# Altium footprint library WTR-PCB_LIB.PcbLib: 44 footprints (part 1 of 3)
Each footprint in its own frame and in the unit in brackets; x right, y up, seen from the top. Pads: shape width x height; smd on the part's side, far side on the other; paste and mask are expansions set on the pad; w line width, h text height; cw(c..) or ccw(c..) is an arc to the next point about the centre after c.
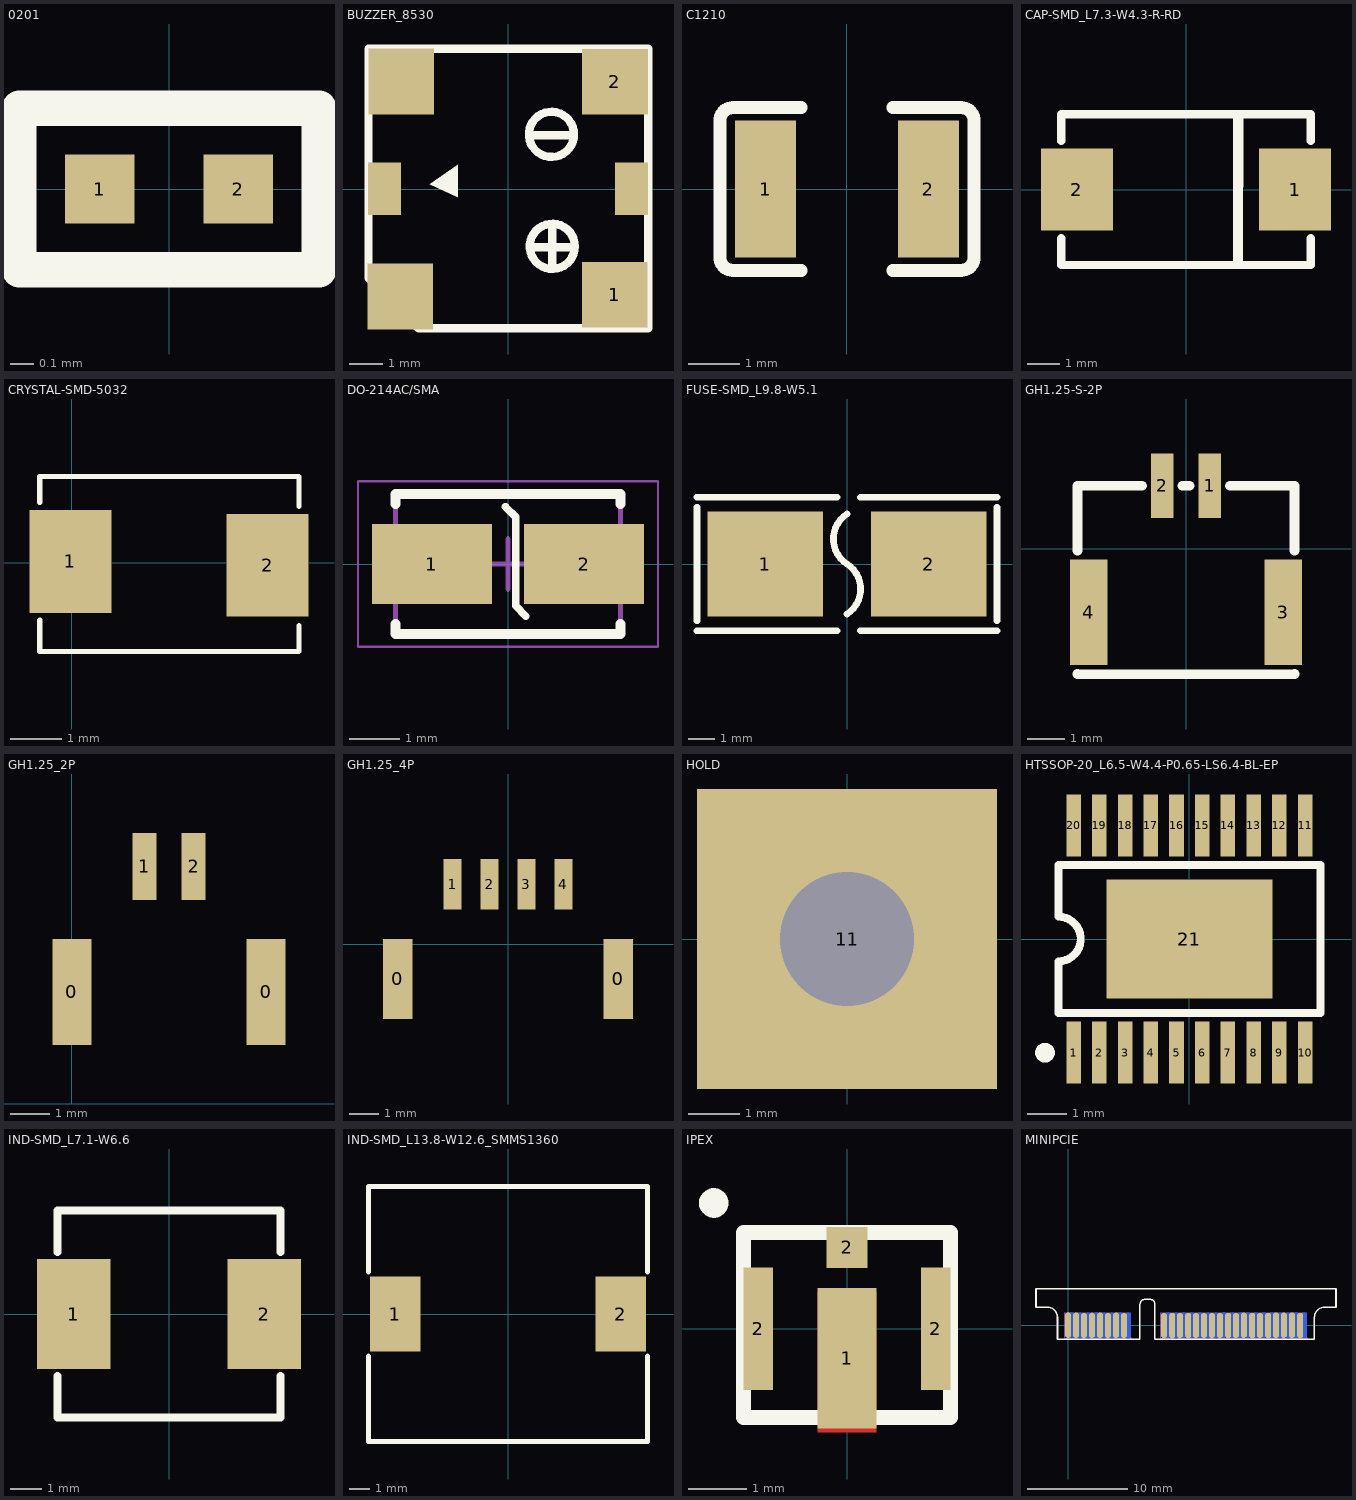
[diagram p0: the footprints below, top view; thin cyan lines are the x and y axes]

## 0201 [mm]
pads (2):
  rect 0.3x0.3 smd: 1(-0.3,0) 2(0.3,0)
Top Overlay:
  lines w0.152: -0.65,-0.35 -0.65,0.35 0.65,0.35 0.65,-0.35 -0.65,-0.35
3D body "R 0201.STEP": height 0.23, standoff 0, extent -0.3,-0.15 0.3,0.15

## BUZZER_8530 [mm]
pads (6):
  rect 2x2 smd: 1(3.242,-3.217) 2(3.251,3.26) ""(-3.277,-3.267) ""(-3.242,3.267)
  rect 1x1.6 smd: ""(-3.759,0.009) ""(3.759,0.009)
Top Overlay:
  circle w0.254: c1.346,-1.743 r0.686
  circle w0.254: c1.321,1.66 r0.686
  region: -2.38,0.144 -1.524,0.743 -1.524,-0.255
  lines w0.254: 0.686,-1.769 2.032,-1.769 ; 0.806,1.635 2.007,1.635 ; 1.346,-2.429 1.346,-1.083 ; -4.242,-2.709 -2.718,-4.233 4.258,-4.233 4.258,4.267 -4.242,4.267 -4.242,-2.709
3D body "User Library-MLT-8530.STEP": height 3, standoff 0, extent -4.377,-4.377 4.123,4.123

## C1210 [mm]
pads (2):
  rect 1.2x2.7 smd: 1(-1.6,0) 2(1.6,0)
Top Overlay:
  lines w0.254: -0.9,-1.6 -2.2,-1.6 -2.25,-1.6 cw(c-2.25,-1.35) -2.5,-1.35 -2.5,1.35 cw(c-2.25,1.35) -2.25,1.6 -2.2,1.6 -0.9,1.6 ; 0.9,-1.6 2.2,-1.6 2.25,-1.6 ccw(c2.25,-1.35) 2.5,-1.35 2.5,1.35 ccw(c2.25,1.35) 2.25,1.6 2.2,1.6 ; 0.9,1.6 2.2,1.6 ; 2.2,1.6 2.2,1.6

## CAP-SMD_L7.3-W4.3-R-RD [mm]
pads (2):
  rect 2.2x2.5 smd: 1(3.325,0) 2(-3.325,0)
Top Overlay:
  region: 1.448,2.286 1.448,-2.235 1.727,-2.235 1.753,2.337
  lines w0.254: -3.8,-1.481 -3.8,-2.3 3.8,-2.3 3.8,-1.481 ; -3.8,1.481 -3.8,2.3 3.8,2.3 3.8,1.481

## CRYSTAL-SMD-5032 [mm]
pads (2):
  rect 1.6x2 smd: 1(-0.025,0.025) 2(3.81,-0.051)
Top Overlay:
  lines w0.1: -0.622,-1.118 -0.622,-1.727 4.42,-1.727 4.42,-1.219 ; -0.622,1.168 -0.622,1.676 4.42,1.676 4.42,1.092
3D body "User Library-445-CRYTAL-SMD.STEP": height 1.35, standoff 0, extent -0.62,-1.625 4.38,1.575

## DO-214AC/SMA [mm] "SS54"
height 2.42
pads (2):
  rect 2.4x1.6 smd: 1(-1.525,0) 2(1.525,0)
Top Overlay:
  lines w0.152: -0.051,1.143 0.152,0.94 0.152,-0.838 0.356,-1.041
  lines w0.2: -2.25,-1.2 -2.25,-1.4 2.25,-1.4 2.25,-1.2 ; -2.25,1.2 -2.25,1.4 2.25,1.4 2.25,1.2
Top Assembly:
  lines w0.1: -2.25,-1.4 -2.25,1.4 2.25,1.4 2.25,-1.4 -2.25,-1.4
Top Courtyard:
  lines w0.05: -3,-1.65 -3,1.65 3,1.65 3,-1.65 -3,-1.65
  lines w0.1: -0.5,0 0.5,0 ; 0,-0.5 0,0.5
3D body: height 2.42, standoff 0, extent -2.25,-1.4 2.25,1.4

## FUSE-SMD_L9.8-W5.1 [mm]
pads (2):
  rect 4.4x4 smd: 1(-3.11,0) 2(3.11,0)
Top Overlay:
  lines w0.254: -5.715,-2.54 -0.381,-2.54 ; -5.715,-2.159 -5.715,2.159 ; -5.715,2.54 -0.381,2.54 ; 0,-1.905 ccw(c-0.611,-0.953) 0,0 cw(c0.611,0.953) 0,1.905 ; 0.508,-2.54 5.715,-2.54 ; 0.508,2.54 5.715,2.54 ; 5.715,-2.159 5.715,2.159

## GH1.25-S-2P [mm]
pads (4):
  rect 0.6x1.7 smd: 1(0.625,1.675) 2(-0.625,1.675)
  rect 1x2.8 smd: 3(2.575,-1.675) 4(-2.575,-1.675)
Top Overlay:
  lines w0.254: -2.875,-3.306 -2.875,-3.325 2.875,-3.325 2.875,-3.306 ; -2.875,-0.044 -2.875,1.675 -1.156,1.675 ; -0.094,1.675 0.094,1.675 ; 1.156,1.675 2.875,1.675 2.875,-0.044

## GH1.25_2P [mm]
pads (4):
  rect 1x2.7 smd: 0(0,2.845) 0(4.95,2.845)
  rect 0.6x1.7 smd: 1(1.85,6.045) 2(3.1,6.045)

## GH1.25_4P [mm]
pads (6):
  rect 1x2.7 smd: 0(-3.725,-1.175) 0(3.725,-1.175)
  rect 0.6x1.7 smd: 1(-1.875,2.025) 2(-0.625,2.025) 3(0.625,2.025) 4(1.875,2.025)

## HOLD [mm]
pads (1):
  rect 5.8x5.8 hole 2.6: 11(0,0)

## HTSSOP-20_L6.5-W4.4-P0.65-LS6.4-BL-EP [mil]
pads (21):
  rect 14.5x61.5 smd: 1(-115.16,-113) 2(-89.57,-113) 3(-63.98,-113) 4(-38.39,-113) 5(-12.79,-113) 6(12.79,-113) 7(38.39,-113) 8(63.98,-113) 9(89.57,-113) 10(115.16,-113) 11(115.16,113) 12(89.57,113) 13(63.98,113) 14(38.39,113) 15(12.79,113) 16(-12.79,113) 17(-38.39,113) 18(-63.98,113) 19(-89.57,113) 20(-115.16,113)
  rect 165.35x118.11 smd: 21(0,0)
Top Overlay:
  lines w7.9: -130.31,-73.47 130.31,-73.47 130.31,73.48 -130.31,73.48 -130.31,22.3 cw(c-130.31,0) -130.3,-22.3 -130.31,-73.47
  lines w9.8: -143.7,-108.3 ccw(c-143.65,-113.2) -143.6,-108.3

## IND-SMD_L7.1-W6.6 [mm]
pads (2):
  rect 2.35x3.5 smd: 1(-3.035,0) 2(3.035,0)
Top Overlay:
  lines w0.254: -3.55,-1.981 -3.55,-3.3 3.55,-3.3 3.55,-1.981 ; -3.55,1.981 -3.55,3.3 3.55,3.3 3.55,1.981

## IND-SMD_L13.8-W12.6_SMMS1360 [mm]
pads (2):
  rect 2.5x3.7 smd: 1(-5.565,0) 2(5.565,0)
Top Overlay:
  lines w0.254: -6.9,-2.081 -6.9,-6.3 6.9,-6.3 6.9,-2.081 ; -6.9,2.081 -6.9,6.3 6.9,6.3 6.9,2.081

## IPEX [mm]
pads (4):
  rect 1.016x2.413 smd: 1(0,-0.508)
  rect 0.5x2.1 smd: 2(-1.524,0) 2(1.524,0)
  rect 0.7x0.7 smd: 2(0,1.397)
Top Layer:
  rectangle: -0.508,-1.778 0.508,0.635
Top Overlay:
  circle w0.254: c-2.286,2.159 r0.127
  lines w0.254: -1.778,-1.524 -0.635,-1.524 0.635,-1.524 1.778,-1.524 1.778,1.651 -1.778,1.651 -1.778,-1.524
3D body: height 0.25, standoff 0, extent 0.762,1.016 0.762,1.016
3D body: height 0.25, standoff 0, extent 0.762,1.016 0.762,1.016
3D body "User Library-IPEX.STEP": height 1.25, standoff -0.01, extent -1.526,-1.399 1.474,1.701

## MINIPCIE [mm] "30mm*50.95mm*1mm"
pads (52):
  oval 0.6x2.55 smd: 1(0,0) 3(0.8,0) 5(1.593,-0.029) 7(2.395,-0.021) 9(3.2,0) 11(3.993,-0.029) 13(4.8,0) 15(5.593,-0.029) 17(9.593,-0.029) 19(10.418,-0.029) 21(11.193,-0.029) 23(12.018,-0.029) 25(12.793,-0.029) 27(13.593,-0.029) 29(14.393,-0.029) 31(15.193,-0.029) 33(16.018,-0.029) 35(16.793,-0.029) 37(17.586,0) 39(18.418,-0.029) 41(19.193,-0.029) 43(20.018,-0.029) 45(20.8,0) 47(21.586,0) 49(22.4,0) 51(23.218,-0.029)
  oval 0.6x2.55 smd far side: 2(0.386,0) 4(1.193,-0.029) 6(1.993,-0.029) 8(2.8,0) 10(3.593,-0.029) 12(4.393,-0.029) 14(5.2,0) 16(5.993,-0.029) 18(10.015,0) 20(10.793,-0.029) 22(11.586,0) 24(12.386,0) 26(13.186,0) 28(13.993,-0.029) 30(14.793,-0.029) 32(15.603,0.013) 34(16.4,0) 36(17.2,0) 38(17.986,0) 40(18.786,0) 42(19.586,0) 44(20.386,0) 46(21.191,-0.038) 48(21.993,-0.029) 50(22.8,0) 52(23.586,0)
Top Overlay:
  lines w0.152: -3.207,1.796 -2.057,1.796 cw(c-2.057,0.796) -1.057,0.796 -1.057,-1.404 7.193,-1.404 7.193,2.096 cw(c7.693,2.096) 7.693,2.596 8.193,2.596 cw(c8.193,2.096) 8.693,2.096 8.693,-1.404 24.643,-1.404 24.643,0.796 cw(c25.643,0.796) 25.643,1.796 26.797,1.796 26.797,3.651 -3.207,3.651 -3.207,1.796
Mechanical 1:
  drawing of 174 lines, arcs and shapes, not listed
Mechanical 7:
  drawing of 179 lines, arcs and shapes, not listed